# Altium schematic symbol library jlcpcb_2025_04_capacitors_extended_0402.schlib: 3594 symbols (part 6 of 20)
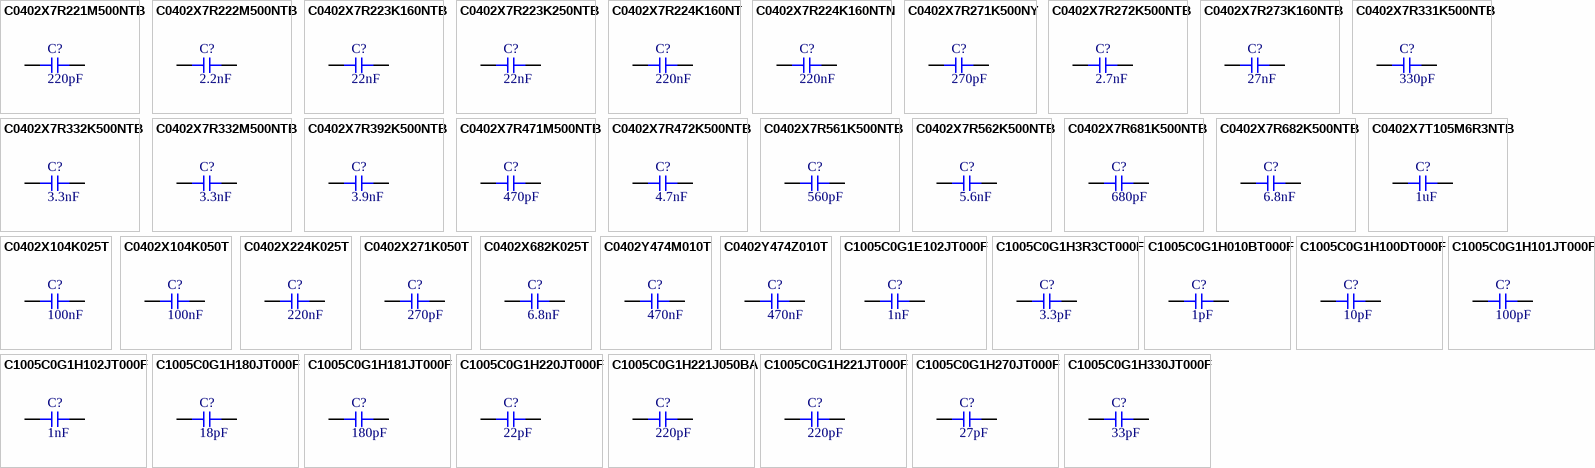
[diagram p94: symbols C0402X7R221M500NTB to C1005C0G1H330JT000F]

## C1005C0G1H221J050BA
designator C?  Capacitance: 220pF  (hidden comment: *)
Capacitor, Ceramic (MLCC), 220pF, ±5%, 50V, C0G, ±5%, SMD 0402; Manufacturer: TDK; Manufacturer Part Number: C1005C0G1H221J050BA; Package Size: 0402; JLCPCB Basic Part: No; JLCPCB Part Number: C2168956; Supplier 1: LCSC; Category: Capacitors - MLCC; Supplier Part Number 1: C2168956; Tolerance: ±5%; Voltage Rating: 50V; Temperature Coefficient: C0G; RoHS: Yes; ComponentLink1Description: Datasheet; ComponentLink1URL: https://wmsc.lcsc.com/wmsc/upload/file/pdf/v2/lcsc/2304140030_TDK-C1005C0G1H221J050BA_C2168956.pdf; ComponentLink2Description: JLCPCB Part URL; ComponentLink2URL: https://jlcpcb.com/partdetail/C2168956; ComponentLink3Description: LCSC Part URL; ComponentLink3URL: https://lcsc.com/product-detail/Multilayer-Ceramic-Capacitors-MLCC---SMD-SMT_TDK-TDK-C1005C0G1H221J050BA_C2168956.html
footprint CAP-0402 (0402 (1005M) Capacitor)
pins: 1, 2

## C1005C0G1H221JT000F
designator C?  Capacitance: 220pF  (hidden comment: *)
Capacitor, Ceramic (MLCC), 220pF, ±5%, 50V, C0G, ±5%, SMD 0402; Manufacturer: TDK; Manufacturer Part Number: C1005C0G1H221JT000F; Package Size: 0402; JLCPCB Basic Part: No; JLCPCB Part Number: C695125; Supplier 1: LCSC; Category: Capacitors - MLCC; Supplier Part Number 1: C695125; Tolerance: ±5%; Voltage Rating: 50V; Temperature Coefficient: C0G; RoHS: Yes; ComponentLink1Description: Datasheet; ComponentLink1URL: https://wmsc.lcsc.com/wmsc/upload/file/pdf/v2/lcsc/2304140030_TDK-C1005C0G1H221JT000F_C695125.pdf; ComponentLink2Description: JLCPCB Part URL; ComponentLink2URL: https://jlcpcb.com/partdetail/C695125; ComponentLink3Description: LCSC Part URL; ComponentLink3URL: https://lcsc.com/product-detail/Multilayer-Ceramic-Capacitors-MLCC---SMD-SMT_TDK-TDK-C1005C0G1H221JT000F_C695125.html
footprint CAP-0402 (0402 (1005M) Capacitor)
pins: 1, 2

## C1005C0G1H270JT000F
designator C?  Capacitance: 27pF  (hidden comment: *)
Capacitor, Ceramic (MLCC), 27pF, ±5%, 50V, C0G, ±5%, SMD 0402; Manufacturer: TDK; Manufacturer Part Number: C1005C0G1H270JT000F; Package Size: 0402; JLCPCB Basic Part: No; JLCPCB Part Number: C445761; Supplier 1: LCSC; Category: Capacitors - MLCC; Supplier Part Number 1: C445761; Tolerance: ±5%; Voltage Rating: 50V; Temperature Coefficient: C0G; RoHS: Yes; ComponentLink1Description: Datasheet; ComponentLink1URL: https://wmsc.lcsc.com/wmsc/upload/file/pdf/v2/lcsc/2304140030_TDK-C1005C0G1H270JT000F_C445761.pdf; ComponentLink2Description: JLCPCB Part URL; ComponentLink2URL: https://jlcpcb.com/partdetail/C445761; ComponentLink3Description: LCSC Part URL; ComponentLink3URL: https://lcsc.com/product-detail/Multilayer-Ceramic-Capacitors-MLCC---SMD-SMT_TDK-TDK-C1005C0G1H270JT000F_C445761.html
footprint CAP-0402 (0402 (1005M) Capacitor)
pins: 1, 2

## C1005C0G1H330JT000F
designator C?  Capacitance: 33pF  (hidden comment: *)
Capacitor, Ceramic (MLCC), 33pF, ±5%, 50V, C0G, ±5%, SMD 0402; Manufacturer: TDK; Manufacturer Part Number: C1005C0G1H330JT000F; Package Size: 0402; JLCPCB Basic Part: No; JLCPCB Part Number: C445760; Supplier 1: LCSC; Category: Capacitors - MLCC; Supplier Part Number 1: C445760; Tolerance: ±5%; Voltage Rating: 50V; Temperature Coefficient: C0G; RoHS: Yes; ComponentLink1Description: Datasheet; ComponentLink1URL: https://wmsc.lcsc.com/wmsc/upload/file/pdf/v2/lcsc/2304140030_TDK-C1005C0G1H330JT000F_C445760.pdf; ComponentLink2Description: JLCPCB Part URL; ComponentLink2URL: https://jlcpcb.com/partdetail/C445760; ComponentLink3Description: LCSC Part URL; ComponentLink3URL: https://lcsc.com/product-detail/Multilayer-Ceramic-Capacitors-MLCC---SMD-SMT_TDK-TDK-C1005C0G1H330JT000F_C445760.html
footprint CAP-0402 (0402 (1005M) Capacitor)
pins: 1, 2

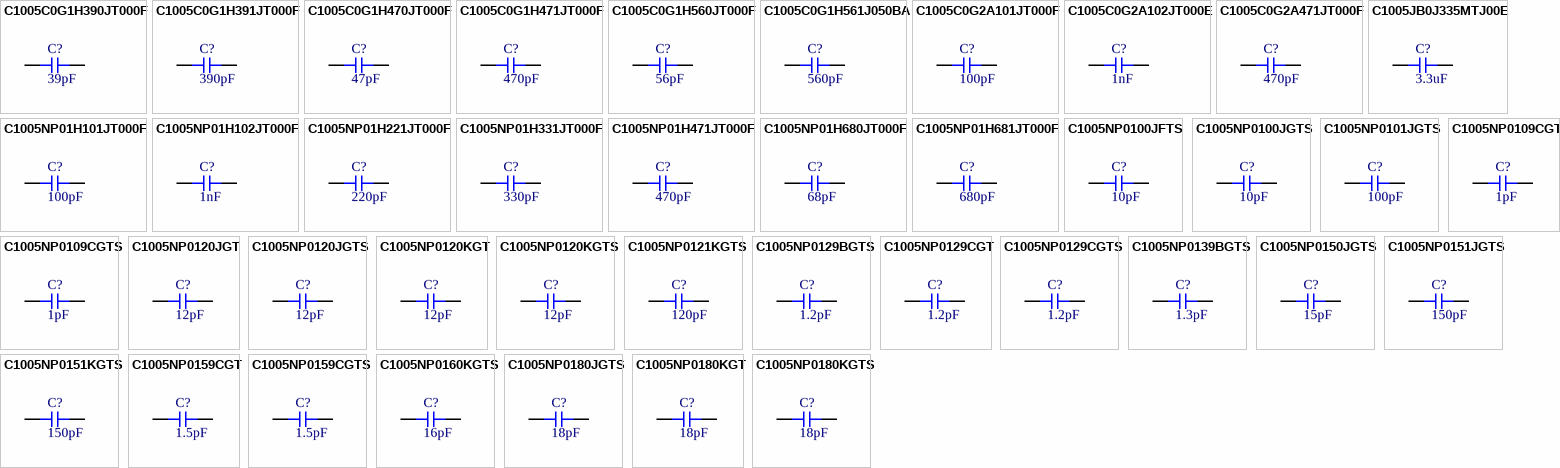
[diagram p23: symbols C1005C0G1H390JT000F to C1005NP0180KGTS]

## C1005C0G1H390JT000F
designator C?  Capacitance: 39pF  (hidden comment: *)
Capacitor, Ceramic (MLCC), 39pF, ±5%, 50V, C0G, ±5%, SMD 0402; Manufacturer: TDK; Manufacturer Part Number: C1005C0G1H390JT000F; Package Size: 0402; JLCPCB Basic Part: No; JLCPCB Part Number: C694151; Supplier 1: LCSC; Category: Capacitors - MLCC; Supplier Part Number 1: C694151; Tolerance: ±5%; Voltage Rating: 50V; Temperature Coefficient: C0G; RoHS: Yes; ComponentLink1Description: Datasheet; ComponentLink1URL: https://wmsc.lcsc.com/wmsc/upload/file/pdf/v2/lcsc/2304140030_TDK-C1005C0G1H390JT000F_C694151.pdf; ComponentLink2Description: JLCPCB Part URL; ComponentLink2URL: https://jlcpcb.com/partdetail/C694151; ComponentLink3Description: LCSC Part URL; ComponentLink3URL: https://lcsc.com/product-detail/Multilayer-Ceramic-Capacitors-MLCC---SMD-SMT_TDK-TDK-C1005C0G1H390JT000F_C694151.html
footprint CAP-0402 (0402 (1005M) Capacitor)
pins: 1, 2

## C1005C0G1H391JT000F
designator C?  Capacitance: 390pF  (hidden comment: *)
Capacitor, Ceramic (MLCC), 390pF, ±5%, 50V, C0G, ±5%, SMD 0402; Manufacturer: TDK; Manufacturer Part Number: C1005C0G1H391JT000F; Package Size: 0402; JLCPCB Basic Part: No; JLCPCB Part Number: C76592; Supplier 1: LCSC; Category: Capacitors - MLCC; Supplier Part Number 1: C76592; Tolerance: ±5%; Voltage Rating: 50V; Temperature Coefficient: C0G; RoHS: Yes; ComponentLink1Description: Datasheet; ComponentLink1URL: https://wmsc.lcsc.com/wmsc/upload/file/pdf/v2/lcsc/2304140030_TDK-C1005C0G1H391JT000F_C76592.pdf; ComponentLink2Description: JLCPCB Part URL; ComponentLink2URL: https://jlcpcb.com/partdetail/C76592; ComponentLink3Description: LCSC Part URL; ComponentLink3URL: https://lcsc.com/product-detail/Multilayer-Ceramic-Capacitors-MLCC---SMD-SMT_TDK-TDK-C1005C0G1H391JT000F_C76592.html
footprint CAP-0402 (0402 (1005M) Capacitor)
pins: 1, 2

## C1005C0G1H470JT000F
designator C?  Capacitance: 47pF  (hidden comment: *)
Capacitor, Ceramic (MLCC), 47pF, ±5%, 50V, C0G, ±5%, SMD 0402; Manufacturer: TDK; Manufacturer Part Number: C1005C0G1H470JT000F; Package Size: 0402; JLCPCB Basic Part: No; JLCPCB Part Number: C694269; Supplier 1: LCSC; Category: Capacitors - MLCC; Supplier Part Number 1: C694269; Tolerance: ±5%; Voltage Rating: 50V; Temperature Coefficient: C0G; RoHS: Yes; ComponentLink1Description: Datasheet; ComponentLink1URL: https://wmsc.lcsc.com/wmsc/upload/file/pdf/v2/lcsc/2304140030_TDK-C1005C0G1H470JT000F_C694269.pdf; ComponentLink2Description: JLCPCB Part URL; ComponentLink2URL: https://jlcpcb.com/partdetail/C694269; ComponentLink3Description: LCSC Part URL; ComponentLink3URL: https://lcsc.com/product-detail/Multilayer-Ceramic-Capacitors-MLCC---SMD-SMT_TDK-TDK-C1005C0G1H470JT000F_C694269.html
footprint CAP-0402 (0402 (1005M) Capacitor)
pins: 1, 2

## C1005C0G1H471JT000F
designator C?  Capacitance: 470pF  (hidden comment: *)
Capacitor, Ceramic (MLCC), 470pF, ±5%, 50V, C0G, ±5%, SMD 0402; Manufacturer: TDK; Manufacturer Part Number: C1005C0G1H471JT000F; Package Size: 0402; JLCPCB Basic Part: No; JLCPCB Part Number: C694153; Supplier 1: LCSC; Category: Capacitors - MLCC; Supplier Part Number 1: C694153; Tolerance: ±5%; Voltage Rating: 50V; Temperature Coefficient: C0G; RoHS: Yes; ComponentLink1Description: Datasheet; ComponentLink1URL: https://wmsc.lcsc.com/wmsc/upload/file/pdf/v2/lcsc/2304140030_TDK-C1005C0G1H471JT000F_C694153.pdf; ComponentLink2Description: JLCPCB Part URL; ComponentLink2URL: https://jlcpcb.com/partdetail/C694153; ComponentLink3Description: LCSC Part URL; ComponentLink3URL: https://lcsc.com/product-detail/Multilayer-Ceramic-Capacitors-MLCC---SMD-SMT_TDK-TDK-C1005C0G1H471JT000F_C694153.html
footprint CAP-0402 (0402 (1005M) Capacitor)
pins: 1, 2

## C1005C0G1H560JT000F
designator C?  Capacitance: 56pF  (hidden comment: *)
Capacitor, Ceramic (MLCC), 56pF, ±5%, 50V, C0G, ±5%, SMD 0402; Manufacturer: TDK; Manufacturer Part Number: C1005C0G1H560JT000F; Package Size: 0402; JLCPCB Basic Part: No; JLCPCB Part Number: C694155; Supplier 1: LCSC; Category: Capacitors - MLCC; Supplier Part Number 1: C694155; Tolerance: ±5%; Voltage Rating: 50V; Temperature Coefficient: C0G; RoHS: Yes; ComponentLink1Description: Datasheet; ComponentLink1URL: https://wmsc.lcsc.com/wmsc/upload/file/pdf/v2/lcsc/2304140030_TDK-C1005C0G1H560JT000F_C694155.pdf; ComponentLink2Description: JLCPCB Part URL; ComponentLink2URL: https://jlcpcb.com/partdetail/C694155; ComponentLink3Description: LCSC Part URL; ComponentLink3URL: https://lcsc.com/product-detail/Multilayer-Ceramic-Capacitors-MLCC---SMD-SMT_TDK-TDK-C1005C0G1H560JT000F_C694155.html
footprint CAP-0402 (0402 (1005M) Capacitor)
pins: 1, 2

## C1005C0G1H561J050BA
designator C?  Capacitance: 560pF  (hidden comment: *)
Capacitor, Ceramic (MLCC), 560pF, ±5%, 50V, C0G, ±5%, SMD 0402; Manufacturer: TDK; Manufacturer Part Number: C1005C0G1H561J050BA; Package Size: 0402; JLCPCB Basic Part: No; JLCPCB Part Number: C3877038; Supplier 1: LCSC; Category: Capacitors - MLCC; Supplier Part Number 1: C3877038; Tolerance: ±5%; Voltage Rating: 50V; Temperature Coefficient: C0G; RoHS: Yes; ComponentLink1Description: Datasheet; ComponentLink1URL: https://wmsc.lcsc.com/wmsc/upload/file/pdf/v2/lcsc/2401221347_TDK-C1005C0G1H561J050BA_C3877038.pdf; ComponentLink2Description: JLCPCB Part URL; ComponentLink2URL: https://jlcpcb.com/partdetail/C3877038; ComponentLink3Description: LCSC Part URL; ComponentLink3URL: https://lcsc.com/product-detail/Multilayer-Ceramic-Capacitors-MLCC---SMD-SMT_TDK-TDK-C1005C0G1H561J050BA_C3877038.html
footprint CAP-0402 (0402 (1005M) Capacitor)
pins: 1, 2

## C1005C0G2A101JT000F
designator C?  Capacitance: 100pF  (hidden comment: *)
Capacitor, Ceramic (MLCC), 100pF, ±5%, 100V, C0G, ±5%, SMD 0402; Manufacturer: TDK; Manufacturer Part Number: C1005C0G2A101JT000F; Package Size: 0402; JLCPCB Basic Part: No; JLCPCB Part Number: C343055; Supplier 1: LCSC; Category: Capacitors - MLCC; Supplier Part Number 1: C343055; Tolerance: ±5%; Voltage Rating: 100V; Temperature Coefficient: C0G; RoHS: Yes; ComponentLink1Description: Datasheet; ComponentLink1URL: https://wmsc.lcsc.com/wmsc/upload/file/pdf/v2/lcsc/2304140030_TDK-C1005C0G2A101JT000F_C343055.pdf; ComponentLink2Description: JLCPCB Part URL; ComponentLink2URL: https://jlcpcb.com/partdetail/C343055; ComponentLink3Description: LCSC Part URL; ComponentLink3URL: https://lcsc.com/product-detail/Multilayer-Ceramic-Capacitors-MLCC---SMD-SMT_TDK-TDK-C1005C0G2A101JT000F_C343055.html
footprint CAP-0402 (0402 (1005M) Capacitor)
pins: 1, 2

## C1005C0G2A102JT000E
designator C?  Capacitance: 1nF  (hidden comment: *)
Capacitor, Ceramic (MLCC), 1nF, ±5%, 100V, C0G, ±5%, SMD 0402; Manufacturer: TDK; Manufacturer Part Number: C1005C0G2A102JT000E; Package Size: 0402; JLCPCB Basic Part: No; JLCPCB Part Number: C694157; Supplier 1: LCSC; Category: Capacitors - MLCC; Supplier Part Number 1: C694157; Tolerance: ±5%; Voltage Rating: 100V; Temperature Coefficient: C0G; RoHS: Yes; ComponentLink1Description: Datasheet; ComponentLink1URL: https://wmsc.lcsc.com/wmsc/upload/file/pdf/v2/lcsc/2304140030_TDK-C1005C0G2A102JT000E_C694157.pdf; ComponentLink2Description: JLCPCB Part URL; ComponentLink2URL: https://jlcpcb.com/partdetail/C694157; ComponentLink3Description: LCSC Part URL; ComponentLink3URL: https://lcsc.com/product-detail/Multilayer-Ceramic-Capacitors-MLCC---SMD-SMT_TDK-TDK-C1005C0G2A102JT000E_C694157.html
footprint CAP-0402 (0402 (1005M) Capacitor)
pins: 1, 2

## C1005C0G2A471JT000F
designator C?  Capacitance: 470pF  (hidden comment: *)
Capacitor, Ceramic (MLCC), 470pF, ±5%, 100V, C0G, ±5%, SMD 0402; Manufacturer: TDK; Manufacturer Part Number: C1005C0G2A471JT000F; Package Size: 0402; JLCPCB Basic Part: No; JLCPCB Part Number: C694158; Supplier 1: LCSC; Category: Capacitors - MLCC; Supplier Part Number 1: C694158; Tolerance: ±5%; Voltage Rating: 100V; Temperature Coefficient: C0G; RoHS: Yes; ComponentLink1Description: Datasheet; ComponentLink1URL: https://wmsc.lcsc.com/wmsc/upload/file/pdf/v2/lcsc/2304140030_TDK-C1005C0G2A471JT000F_C694158.pdf; ComponentLink2Description: JLCPCB Part URL; ComponentLink2URL: https://jlcpcb.com/partdetail/C694158; ComponentLink3Description: LCSC Part URL; ComponentLink3URL: https://lcsc.com/product-detail/Multilayer-Ceramic-Capacitors-MLCC---SMD-SMT_TDK-TDK-C1005C0G2A471JT000F_C694158.html
footprint CAP-0402 (0402 (1005M) Capacitor)
pins: 1, 2

## C1005JB0J335MTJ00E
designator C?  Capacitance: 3.3uF  (hidden comment: *)
Capacitor, Ceramic (MLCC), 3.3uF, ±20%, 6.3V, ±20%, SMD 0402; Manufacturer: TDK; Manufacturer Part Number: C1005JB0J335MTJ00E; Package Size: 0402; JLCPCB Basic Part: No; JLCPCB Part Number: C694159; Supplier 1: LCSC; Category: Capacitors - MLCC; Supplier Part Number 1: C694159; Tolerance: ±20%; Voltage Rating: 6.3V; RoHS: Yes; ComponentLink1Description: Datasheet; ComponentLink1URL: https://wmsc.lcsc.com/wmsc/upload/file/pdf/v2/lcsc/2304140030_TDK-C1005JB0J335MTJ00E_C694159.pdf; ComponentLink2Description: JLCPCB Part URL; ComponentLink2URL: https://jlcpcb.com/partdetail/C694159; ComponentLink3Description: LCSC Part URL; ComponentLink3URL: https://lcsc.com/product-detail/Multilayer-Ceramic-Capacitors-MLCC---SMD-SMT_TDK-TDK-C1005JB0J335MTJ00E_C694159.html
footprint CAP-0402 (0402 (1005M) Capacitor)
pins: 1, 2

## C1005NP01H101JT000F
designator C?  Capacitance: 100pF  (hidden comment: *)
Capacitor, Ceramic (MLCC), 100pF, ±5%, 50V, NP0, ±5%, SMD 0402; Manufacturer: TDK; Manufacturer Part Number: C1005NP01H101JT000F; Package Size: 0402; JLCPCB Basic Part: No; JLCPCB Part Number: C343043; Supplier 1: LCSC; Category: Capacitors - MLCC; Supplier Part Number 1: C343043; Tolerance: ±5%; Voltage Rating: 50V; Temperature Coefficient: NP0; RoHS: Yes; ComponentLink1Description: Datasheet; ComponentLink1URL: https://wmsc.lcsc.com/wmsc/upload/file/pdf/v2/lcsc/2304140030_TDK-C1005NP01H101JT000F_C343043.pdf; ComponentLink2Description: JLCPCB Part URL; ComponentLink2URL: https://jlcpcb.com/partdetail/C343043; ComponentLink3Description: LCSC Part URL; ComponentLink3URL: https://lcsc.com/product-detail/Multilayer-Ceramic-Capacitors-MLCC---SMD-SMT_TDK-TDK-C1005NP01H101JT000F_C343043.html
footprint CAP-0402 (0402 (1005M) Capacitor)
pins: 1, 2

## C1005NP01H102JT000F
designator C?  Capacitance: 1nF  (hidden comment: *)
Capacitor, Ceramic (MLCC), 1nF, ±5%, 50V, NP0, ±5%, SMD 0402; Manufacturer: TDK; Manufacturer Part Number: C1005NP01H102JT000F; Package Size: 0402; JLCPCB Basic Part: No; JLCPCB Part Number: C342982; Supplier 1: LCSC; Category: Capacitors - MLCC; Supplier Part Number 1: C342982; Tolerance: ±5%; Voltage Rating: 50V; Temperature Coefficient: NP0; RoHS: Yes; ComponentLink1Description: Datasheet; ComponentLink1URL: https://wmsc.lcsc.com/wmsc/upload/file/pdf/v2/lcsc/2304140030_TDK-C1005NP01H102JT000F_C342982.pdf; ComponentLink2Description: JLCPCB Part URL; ComponentLink2URL: https://jlcpcb.com/partdetail/C342982; ComponentLink3Description: LCSC Part URL; ComponentLink3URL: https://lcsc.com/product-detail/Multilayer-Ceramic-Capacitors-MLCC---SMD-SMT_TDK-TDK-C1005NP01H102JT000F_C342982.html
footprint CAP-0402 (0402 (1005M) Capacitor)
pins: 1, 2

## C1005NP01H221JT000F
designator C?  Capacitance: 220pF  (hidden comment: *)
Capacitor, Ceramic (MLCC), 220pF, ±5%, 50V, NP0, ±5%, SMD 0402; Manufacturer: TDK; Manufacturer Part Number: C1005NP01H221JT000F; Package Size: 0402; JLCPCB Basic Part: No; JLCPCB Part Number: C343023; Supplier 1: LCSC; Category: Capacitors - MLCC; Supplier Part Number 1: C343023; Tolerance: ±5%; Voltage Rating: 50V; Temperature Coefficient: NP0; RoHS: Yes; ComponentLink1Description: Datasheet; ComponentLink1URL: https://wmsc.lcsc.com/wmsc/upload/file/pdf/v2/lcsc/2304140030_TDK-C1005NP01H221JT000F_C343023.pdf; ComponentLink2Description: JLCPCB Part URL; ComponentLink2URL: https://jlcpcb.com/partdetail/C343023; ComponentLink3Description: LCSC Part URL; ComponentLink3URL: https://lcsc.com/product-detail/Multilayer-Ceramic-Capacitors-MLCC---SMD-SMT_TDK-TDK-C1005NP01H221JT000F_C343023.html
footprint CAP-0402 (0402 (1005M) Capacitor)
pins: 1, 2

## C1005NP01H331JT000F
designator C?  Capacitance: 330pF  (hidden comment: *)
Capacitor, Ceramic (MLCC), 330pF, ±5%, 50V, NP0, ±5%, SMD 0402; Manufacturer: TDK; Manufacturer Part Number: C1005NP01H331JT000F; Package Size: 0402; JLCPCB Basic Part: No; JLCPCB Part Number: C343018; Supplier 1: LCSC; Category: Capacitors - MLCC; Supplier Part Number 1: C343018; Tolerance: ±5%; Voltage Rating: 50V; Temperature Coefficient: NP0; RoHS: Yes; ComponentLink1Description: Datasheet; ComponentLink1URL: https://wmsc.lcsc.com/wmsc/upload/file/pdf/v2/lcsc/2304140030_TDK-C1005NP01H331JT000F_C343018.pdf; ComponentLink2Description: JLCPCB Part URL; ComponentLink2URL: https://jlcpcb.com/partdetail/C343018; ComponentLink3Description: LCSC Part URL; ComponentLink3URL: https://lcsc.com/product-detail/Multilayer-Ceramic-Capacitors-MLCC---SMD-SMT_TDK-TDK-C1005NP01H331JT000F_C343018.html
footprint CAP-0402 (0402 (1005M) Capacitor)
pins: 1, 2

## C1005NP01H471JT000F
designator C?  Capacitance: 470pF  (hidden comment: *)
Capacitor, Ceramic (MLCC), 470pF, ±5%, 50V, NP0, ±5%, SMD 0402; Manufacturer: TDK; Manufacturer Part Number: C1005NP01H471JT000F; Package Size: 0402; JLCPCB Basic Part: No; JLCPCB Part Number: C343011; Supplier 1: LCSC; Category: Capacitors - MLCC; Supplier Part Number 1: C343011; Tolerance: ±5%; Voltage Rating: 50V; Temperature Coefficient: NP0; RoHS: Yes; ComponentLink1Description: Datasheet; ComponentLink1URL: https://wmsc.lcsc.com/wmsc/upload/file/pdf/v2/lcsc/2304140030_TDK-C1005NP01H471JT000F_C343011.pdf; ComponentLink2Description: JLCPCB Part URL; ComponentLink2URL: https://jlcpcb.com/partdetail/C343011; ComponentLink3Description: LCSC Part URL; ComponentLink3URL: https://lcsc.com/product-detail/Multilayer-Ceramic-Capacitors-MLCC---SMD-SMT_TDK-TDK-C1005NP01H471JT000F_C343011.html
footprint CAP-0402 (0402 (1005M) Capacitor)
pins: 1, 2

## C1005NP01H680JT000F
designator C?  Capacitance: 68pF  (hidden comment: *)
Capacitor, Ceramic (MLCC), 68pF, ±5%, 50V, NP0, ±5%, SMD 0402; Manufacturer: TDK; Manufacturer Part Number: C1005NP01H680JT000F; Package Size: 0402; JLCPCB Basic Part: No; JLCPCB Part Number: C343045; Supplier 1: LCSC; Category: Capacitors - MLCC; Supplier Part Number 1: C343045; Tolerance: ±5%; Voltage Rating: 50V; Temperature Coefficient: NP0; RoHS: Yes; ComponentLink1Description: Datasheet; ComponentLink1URL: https://wmsc.lcsc.com/wmsc/upload/file/pdf/v2/lcsc/1912111437_TDK-C1005NP01H680JT000F_C343045.pdf; ComponentLink2Description: JLCPCB Part URL; ComponentLink2URL: https://jlcpcb.com/partdetail/C343045; ComponentLink3Description: LCSC Part URL; ComponentLink3URL: https://lcsc.com/product-detail/Multilayer-Ceramic-Capacitors-MLCC---SMD-SMT_TDK-TDK-C1005NP01H680JT000F_C343045.html
footprint CAP-0402 (0402 (1005M) Capacitor)
pins: 1, 2

## C1005NP01H681JT000F
designator C?  Capacitance: 680pF  (hidden comment: *)
Capacitor, Ceramic (MLCC), 680pF, ±5%, 50V, NP0, ±5%, SMD 0402; Manufacturer: TDK; Manufacturer Part Number: C1005NP01H681JT000F; Package Size: 0402; JLCPCB Basic Part: No; JLCPCB Part Number: C343004; Supplier 1: LCSC; Category: Capacitors - MLCC; Supplier Part Number 1: C343004; Tolerance: ±5%; Voltage Rating: 50V; Temperature Coefficient: NP0; RoHS: Yes; ComponentLink1Description: Datasheet; ComponentLink1URL: https://wmsc.lcsc.com/wmsc/upload/file/pdf/v2/lcsc/2304140030_TDK-C1005NP01H681JT000F_C343004.pdf; ComponentLink2Description: JLCPCB Part URL; ComponentLink2URL: https://jlcpcb.com/partdetail/C343004; ComponentLink3Description: LCSC Part URL; ComponentLink3URL: https://lcsc.com/product-detail/Multilayer-Ceramic-Capacitors-MLCC---SMD-SMT_TDK-TDK-C1005NP01H681JT000F_C343004.html
footprint CAP-0402 (0402 (1005M) Capacitor)
pins: 1, 2

## C1005NP0100JFTS
designator C?  Capacitance: 10pF  (hidden comment: *)
Capacitor, Ceramic (MLCC), 10pF, 25V, NP0, SMD 0402; Manufacturer: Darfon Elec; Manufacturer Part Number: C1005NP0100JFTS; Package Size: 0402; JLCPCB Basic Part: No; JLCPCB Part Number: C2987820; Supplier 1: LCSC; Category: Capacitors - MLCC; Supplier Part Number 1: C2987820; Voltage Rating: 25V; Temperature Coefficient: NP0; RoHS: Yes; ComponentLink1Description: Datasheet; ComponentLink1URL: https://wmsc.lcsc.com/wmsc/upload/file/pdf/v2/lcsc/2204011630_Darfon-Elec-C1005NP0100JFTS_C2987820.pdf; ComponentLink2Description: JLCPCB Part URL; ComponentLink2URL: https://jlcpcb.com/partdetail/C2987820; ComponentLink3Description: LCSC Part URL; ComponentLink3URL: https://lcsc.com/product-detail/Multilayer-Ceramic-Capacitors-MLCC---SMD-SMT_Darfon-Elec-Darfon-Elec-C1005NP0100JFTS_C2987820.html
footprint CAP-0402 (0402 (1005M) Capacitor)
pins: 1, 2

## C1005NP0100JGTS
designator C?  Capacitance: 10pF  (hidden comment: *)
Capacitor, Ceramic (MLCC), 10pF, ±5%, 50V, NP0, ±5%, SMD 0402; Manufacturer: Darfon Elec; Manufacturer Part Number: C1005NP0100JGTS; Package Size: 0402; JLCPCB Basic Part: No; JLCPCB Part Number: C258501; Supplier 1: LCSC; Category: Capacitors - MLCC; Supplier Part Number 1: C258501; Tolerance: ±5%; Voltage Rating: 50V; Temperature Coefficient: NP0; RoHS: Yes; ComponentLink1Description: Datasheet; ComponentLink1URL: https://wmsc.lcsc.com/wmsc/upload/file/pdf/v2/lcsc/2304140030_Darfon-Elec-C1005NP0100JGTS_C258501.pdf; ComponentLink2Description: JLCPCB Part URL; ComponentLink2URL: https://jlcpcb.com/partdetail/C258501; ComponentLink3Description: LCSC Part URL; ComponentLink3URL: https://lcsc.com/product-detail/Multilayer-Ceramic-Capacitors-MLCC---SMD-SMT_Darfon-Elec-Darfon-Elec-C1005NP0100JGTS_C258501.html
footprint CAP-0402 (0402 (1005M) Capacitor)
pins: 1, 2

## C1005NP0101JGTS
designator C?  Capacitance: 100pF  (hidden comment: *)
Capacitor, Ceramic (MLCC), 100pF, ±5%, 50V, NP0, ±5%, SMD 0402; Manufacturer: Darfon Elec; Manufacturer Part Number: C1005NP0101JGTS; Package Size: 0402; JLCPCB Basic Part: No; JLCPCB Part Number: C147476; Supplier 1: LCSC; Category: Capacitors - MLCC; Supplier Part Number 1: C147476; Tolerance: ±5%; Voltage Rating: 50V; Temperature Coefficient: NP0; RoHS: Yes; ComponentLink1Description: Datasheet; ComponentLink1URL: https://wmsc.lcsc.com/wmsc/upload/file/pdf/v2/lcsc/2304140030_Darfon-Elec-C1005NP0101JGTS_C147476.pdf; ComponentLink2Description: JLCPCB Part URL; ComponentLink2URL: https://jlcpcb.com/partdetail/C147476; ComponentLink3Description: LCSC Part URL; ComponentLink3URL: https://lcsc.com/product-detail/Multilayer-Ceramic-Capacitors-MLCC---SMD-SMT_Darfon-Elec-Darfon-Elec-C1005NP0101JGTS_C147476.html
footprint CAP-0402 (0402 (1005M) Capacitor)
pins: 1, 2

## C1005NP0109CGT
designator C?  Capacitance: 1pF  (hidden comment: *)
Capacitor, Ceramic (MLCC), 1pF, 50V, NP0, SMD 0402; Manufacturer: Darfon Elec; Manufacturer Part Number: C1005NP0109CGT; Package Size: 0402; JLCPCB Basic Part: No; JLCPCB Part Number: C258486; Supplier 1: LCSC; Category: Capacitors - MLCC; Supplier Part Number 1: C258486; Voltage Rating: 50V; Temperature Coefficient: NP0; RoHS: Yes; ComponentLink1Description: Datasheet; ComponentLink1URL: https://wmsc.lcsc.com/wmsc/upload/file/pdf/v2/lcsc/2304140030_Darfon-Elec-C1005NP0109CGT_C258486.pdf; ComponentLink2Description: JLCPCB Part URL; ComponentLink2URL: https://jlcpcb.com/partdetail/C258486; ComponentLink3Description: LCSC Part URL; ComponentLink3URL: https://lcsc.com/product-detail/Multilayer-Ceramic-Capacitors-MLCC---SMD-SMT_Darfon-Elec-Darfon-Elec-C1005NP0109CGT_C258486.html
footprint CAP-0402 (0402 (1005M) Capacitor)
pins: 1, 2

## C1005NP0109CGTS
designator C?  Capacitance: 1pF  (hidden comment: *)
Capacitor, Ceramic (MLCC), 1pF, 50V, NP0, SMD 0402; Manufacturer: Darfon Elec; Manufacturer Part Number: C1005NP0109CGTS; Package Size: 0402; JLCPCB Basic Part: No; JLCPCB Part Number: C147337; Supplier 1: LCSC; Category: Capacitors - MLCC; Supplier Part Number 1: C147337; Voltage Rating: 50V; Temperature Coefficient: NP0; RoHS: Yes; ComponentLink1Description: Datasheet; ComponentLink1URL: https://wmsc.lcsc.com/wmsc/upload/file/pdf/v2/lcsc/2304140030_Darfon-Elec-C1005NP0109CGTS_C147337.pdf; ComponentLink2Description: JLCPCB Part URL; ComponentLink2URL: https://jlcpcb.com/partdetail/C147337; ComponentLink3Description: LCSC Part URL; ComponentLink3URL: https://lcsc.com/product-detail/Multilayer-Ceramic-Capacitors-MLCC---SMD-SMT_Darfon-Elec-Darfon-Elec-C1005NP0109CGTS_C147337.html
footprint CAP-0402 (0402 (1005M) Capacitor)
pins: 1, 2

## C1005NP0120JGT
designator C?  Capacitance: 12pF  (hidden comment: *)
Capacitor, Ceramic (MLCC), 12pF, ±5%, 50V, NP0, ±5%, SMD 0402; Manufacturer: Darfon Elec; Manufacturer Part Number: C1005NP0120JGT; Package Size: 0402; JLCPCB Basic Part: No; JLCPCB Part Number: C359298; Supplier 1: LCSC; Category: Capacitors - MLCC; Supplier Part Number 1: C359298; Tolerance: ±5%; Voltage Rating: 50V; Temperature Coefficient: NP0; RoHS: Yes; ComponentLink1Description: Datasheet; ComponentLink1URL: https://wmsc.lcsc.com/wmsc/upload/file/pdf/v2/lcsc/2304140030_Darfon-Elec-C1005NP0120JGT_C359298.pdf; ComponentLink2Description: JLCPCB Part URL; ComponentLink2URL: https://jlcpcb.com/partdetail/C359298; ComponentLink3Description: LCSC Part URL; ComponentLink3URL: https://lcsc.com/product-detail/Multilayer-Ceramic-Capacitors-MLCC---SMD-SMT_Darfon-Elec-Darfon-Elec-C1005NP0120JGT_C359298.html
footprint CAP-0402 (0402 (1005M) Capacitor)
pins: 1, 2

## C1005NP0120JGTS
designator C?  Capacitance: 12pF  (hidden comment: *)
Capacitor, Ceramic (MLCC), 12pF, ±5%, 50V, NP0, ±5%, SMD 0402; Manufacturer: Darfon Elec; Manufacturer Part Number: C1005NP0120JGTS; Package Size: 0402; JLCPCB Basic Part: No; JLCPCB Part Number: C147414; Supplier 1: LCSC; Category: Capacitors - MLCC; Supplier Part Number 1: C147414; Tolerance: ±5%; Voltage Rating: 50V; Temperature Coefficient: NP0; RoHS: Yes; ComponentLink1Description: Datasheet; ComponentLink1URL: https://wmsc.lcsc.com/wmsc/upload/file/pdf/v2/lcsc/2304140030_Darfon-Elec-C1005NP0120JGTS_C147414.pdf; ComponentLink2Description: JLCPCB Part URL; ComponentLink2URL: https://jlcpcb.com/partdetail/C147414; ComponentLink3Description: LCSC Part URL; ComponentLink3URL: https://lcsc.com/product-detail/Multilayer-Ceramic-Capacitors-MLCC---SMD-SMT_Darfon-Elec-Darfon-Elec-C1005NP0120JGTS_C147414.html
footprint CAP-0402 (0402 (1005M) Capacitor)
pins: 1, 2

## C1005NP0120KGT
designator C?  Capacitance: 12pF  (hidden comment: *)
Capacitor, Ceramic (MLCC), 12pF, ±10%, 50V, NP0, ±10%, SMD 0402; Manufacturer: Darfon Elec; Manufacturer Part Number: C1005NP0120KGT; Package Size: 0402; JLCPCB Basic Part: No; JLCPCB Part Number: C258502; Supplier 1: LCSC; Category: Capacitors - MLCC; Supplier Part Number 1: C258502; Tolerance: ±10%; Voltage Rating: 50V; Temperature Coefficient: NP0; RoHS: Yes; ComponentLink1Description: Datasheet; ComponentLink1URL: https://wmsc.lcsc.com/wmsc/upload/file/pdf/v2/lcsc/2304140030_Darfon-Elec-C1005NP0120KGT_C258502.pdf; ComponentLink2Description: JLCPCB Part URL; ComponentLink2URL: https://jlcpcb.com/partdetail/C258502; ComponentLink3Description: LCSC Part URL; ComponentLink3URL: https://lcsc.com/product-detail/Multilayer-Ceramic-Capacitors-MLCC---SMD-SMT_Darfon-Elec-Darfon-Elec-C1005NP0120KGT_C258502.html
footprint CAP-0402 (0402 (1005M) Capacitor)
pins: 1, 2

## C1005NP0120KGTS
designator C?  Capacitance: 12pF  (hidden comment: *)
Capacitor, Ceramic (MLCC), 12pF, ±10%, 50V, NP0, ±10%, SMD 0402; Manufacturer: Darfon Elec; Manufacturer Part Number: C1005NP0120KGTS; Package Size: 0402; JLCPCB Basic Part: No; JLCPCB Part Number: C312116; Supplier 1: LCSC; Category: Capacitors - MLCC; Supplier Part Number 1: C312116; Tolerance: ±10%; Voltage Rating: 50V; Temperature Coefficient: NP0; RoHS: Yes; ComponentLink1Description: Datasheet; ComponentLink1URL: https://wmsc.lcsc.com/wmsc/upload/file/pdf/v2/lcsc/2304140030_Darfon-Elec-C1005NP0120KGTS_C312116.pdf; ComponentLink2Description: JLCPCB Part URL; ComponentLink2URL: https://jlcpcb.com/partdetail/C312116; ComponentLink3Description: LCSC Part URL; ComponentLink3URL: https://lcsc.com/product-detail/Multilayer-Ceramic-Capacitors-MLCC---SMD-SMT_Darfon-Elec-Darfon-Elec-C1005NP0120KGTS_C312116.html
footprint CAP-0402 (0402 (1005M) Capacitor)
pins: 1, 2

## C1005NP0121KGTS
designator C?  Capacitance: 120pF  (hidden comment: *)
Capacitor, Ceramic (MLCC), 120pF, ±10%, 50V, NP0, ±10%, SMD 0402; Manufacturer: Darfon Elec; Manufacturer Part Number: C1005NP0121KGTS; Package Size: 0402; JLCPCB Basic Part: No; JLCPCB Part Number: C561179; Supplier 1: LCSC; Category: Capacitors - MLCC; Supplier Part Number 1: C561179; Tolerance: ±10%; Voltage Rating: 50V; Temperature Coefficient: NP0; RoHS: Yes; ComponentLink1Description: Datasheet; ComponentLink1URL: https://wmsc.lcsc.com/wmsc/upload/file/pdf/v2/lcsc/2006011904_Darfon-Elec-C1005NP0121KGTS_C561179.pdf; ComponentLink2Description: JLCPCB Part URL; ComponentLink2URL: https://jlcpcb.com/partdetail/C561179; ComponentLink3Description: LCSC Part URL; ComponentLink3URL: https://lcsc.com/product-detail/Multilayer-Ceramic-Capacitors-MLCC---SMD-SMT_Darfon-Elec-Darfon-Elec-C1005NP0121KGTS_C561179.html
footprint CAP-0402 (0402 (1005M) Capacitor)
pins: 1, 2

## C1005NP0129BGTS
designator C?  Capacitance: 1.2pF  (hidden comment: *)
Capacitor, Ceramic (MLCC), 1.2pF, 50V, NP0, SMD 0402; Manufacturer: Darfon Elec; Manufacturer Part Number: C1005NP0129BGTS; Package Size: 0402; JLCPCB Basic Part: No; JLCPCB Part Number: C147339; Supplier 1: LCSC; Category: Capacitors - MLCC; Supplier Part Number 1: C147339; Voltage Rating: 50V; Temperature Coefficient: NP0; RoHS: Yes; ComponentLink1Description: Datasheet; ComponentLink1URL: https://wmsc.lcsc.com/wmsc/upload/file/pdf/v2/lcsc/2304140030_Darfon-Elec-C1005NP0129BGTS_C147339.pdf; ComponentLink2Description: JLCPCB Part URL; ComponentLink2URL: https://jlcpcb.com/partdetail/C147339; ComponentLink3Description: LCSC Part URL; ComponentLink3URL: https://lcsc.com/product-detail/Multilayer-Ceramic-Capacitors-MLCC---SMD-SMT_Darfon-Elec-Darfon-Elec-C1005NP0129BGTS_C147339.html
footprint CAP-0402 (0402 (1005M) Capacitor)
pins: 1, 2

## C1005NP0129CGT
designator C?  Capacitance: 1.2pF  (hidden comment: *)
Capacitor, Ceramic (MLCC), 1.2pF, 50V, NP0, SMD 0402; Manufacturer: Darfon Elec; Manufacturer Part Number: C1005NP0129CGT; Package Size: 0402; JLCPCB Basic Part: No; JLCPCB Part Number: C258487; Supplier 1: LCSC; Category: Capacitors - MLCC; Supplier Part Number 1: C258487; Voltage Rating: 50V; Temperature Coefficient: NP0; RoHS: Yes; ComponentLink1Description: Datasheet; ComponentLink1URL: https://wmsc.lcsc.com/wmsc/upload/file/pdf/v2/lcsc/2304140030_Darfon-Elec-C1005NP0129CGT_C258487.pdf; ComponentLink2Description: JLCPCB Part URL; ComponentLink2URL: https://jlcpcb.com/partdetail/C258487; ComponentLink3Description: LCSC Part URL; ComponentLink3URL: https://lcsc.com/product-detail/Multilayer-Ceramic-Capacitors-MLCC---SMD-SMT_Darfon-Elec-Darfon-Elec-C1005NP0129CGT_C258487.html
footprint CAP-0402 (0402 (1005M) Capacitor)
pins: 1, 2

## C1005NP0129CGTS
designator C?  Capacitance: 1.2pF  (hidden comment: *)
Capacitor, Ceramic (MLCC), 1.2pF, 50V, NP0, SMD 0402; Manufacturer: Darfon Elec; Manufacturer Part Number: C1005NP0129CGTS; Package Size: 0402; JLCPCB Basic Part: No; JLCPCB Part Number: C147340; Supplier 1: LCSC; Category: Capacitors - MLCC; Supplier Part Number 1: C147340; Voltage Rating: 50V; Temperature Coefficient: NP0; RoHS: Yes; ComponentLink1Description: Datasheet; ComponentLink1URL: https://wmsc.lcsc.com/wmsc/upload/file/pdf/v2/lcsc/2304140030_Darfon-Elec-C1005NP0129CGTS_C147340.pdf; ComponentLink2Description: JLCPCB Part URL; ComponentLink2URL: https://jlcpcb.com/partdetail/C147340; ComponentLink3Description: LCSC Part URL; ComponentLink3URL: https://lcsc.com/product-detail/Multilayer-Ceramic-Capacitors-MLCC---SMD-SMT_Darfon-Elec-Darfon-Elec-C1005NP0129CGTS_C147340.html
footprint CAP-0402 (0402 (1005M) Capacitor)
pins: 1, 2

## C1005NP0139BGTS
designator C?  Capacitance: 1.3pF  (hidden comment: *)
Capacitor, Ceramic (MLCC), 1.3pF, 50V, NP0, SMD 0402; Manufacturer: Darfon Elec; Manufacturer Part Number: C1005NP0139BGTS; Package Size: 0402; JLCPCB Basic Part: No; JLCPCB Part Number: C147342; Supplier 1: LCSC; Category: Capacitors - MLCC; Supplier Part Number 1: C147342; Voltage Rating: 50V; Temperature Coefficient: NP0; RoHS: Yes; ComponentLink1Description: Datasheet; ComponentLink1URL: https://wmsc.lcsc.com/wmsc/upload/file/pdf/v2/lcsc/2304140030_Darfon-Elec-C1005NP0139BGTS_C147342.pdf; ComponentLink2Description: JLCPCB Part URL; ComponentLink2URL: https://jlcpcb.com/partdetail/C147342; ComponentLink3Description: LCSC Part URL; ComponentLink3URL: https://lcsc.com/product-detail/Multilayer-Ceramic-Capacitors-MLCC---SMD-SMT_Darfon-Elec-Darfon-Elec-C1005NP0139BGTS_C147342.html
footprint CAP-0402 (0402 (1005M) Capacitor)
pins: 1, 2

## C1005NP0150JGTS
designator C?  Capacitance: 15pF  (hidden comment: *)
Capacitor, Ceramic (MLCC), 15pF, ±5%, 50V, NP0, ±5%, SMD 0402; Manufacturer: Darfon Elec; Manufacturer Part Number: C1005NP0150JGTS; Package Size: 0402; JLCPCB Basic Part: No; JLCPCB Part Number: C147418; Supplier 1: LCSC; Category: Capacitors - MLCC; Supplier Part Number 1: C147418; Tolerance: ±5%; Voltage Rating: 50V; Temperature Coefficient: NP0; RoHS: Yes; ComponentLink1Description: Datasheet; ComponentLink1URL: https://wmsc.lcsc.com/wmsc/upload/file/pdf/v2/lcsc/2304140030_Darfon-Elec-C1005NP0150JGTS_C147418.pdf; ComponentLink2Description: JLCPCB Part URL; ComponentLink2URL: https://jlcpcb.com/partdetail/C147418; ComponentLink3Description: LCSC Part URL; ComponentLink3URL: https://lcsc.com/product-detail/Multilayer-Ceramic-Capacitors-MLCC---SMD-SMT_Darfon-Elec-Darfon-Elec-C1005NP0150JGTS_C147418.html
footprint CAP-0402 (0402 (1005M) Capacitor)
pins: 1, 2

## C1005NP0151JGTS
designator C?  Capacitance: 150pF  (hidden comment: *)
Capacitor, Ceramic (MLCC), 150pF, ±5%, 50V, NP0, ±5%, SMD 0402; Manufacturer: Darfon Elec; Manufacturer Part Number: C1005NP0151JGTS; Package Size: 0402; JLCPCB Basic Part: No; JLCPCB Part Number: C147479; Supplier 1: LCSC; Category: Capacitors - MLCC; Supplier Part Number 1: C147479; Tolerance: ±5%; Voltage Rating: 50V; Temperature Coefficient: NP0; RoHS: Yes; ComponentLink1Description: Datasheet; ComponentLink1URL: https://wmsc.lcsc.com/wmsc/upload/file/pdf/v2/lcsc/2304140030_Darfon-Elec-C1005NP0151JGTS_C147479.pdf; ComponentLink2Description: JLCPCB Part URL; ComponentLink2URL: https://jlcpcb.com/partdetail/C147479; ComponentLink3Description: LCSC Part URL; ComponentLink3URL: https://lcsc.com/product-detail/Multilayer-Ceramic-Capacitors-MLCC---SMD-SMT_Darfon-Elec-Darfon-Elec-C1005NP0151JGTS_C147479.html
footprint CAP-0402 (0402 (1005M) Capacitor)
pins: 1, 2

## C1005NP0151KGTS
designator C?  Capacitance: 150pF  (hidden comment: *)
Capacitor, Ceramic (MLCC), 150pF, ±10%, 50V, NP0, ±10%, SMD 0402; Manufacturer: Darfon Elec; Manufacturer Part Number: C1005NP0151KGTS; Package Size: 0402; JLCPCB Basic Part: No; JLCPCB Part Number: C312107; Supplier 1: LCSC; Category: Capacitors - MLCC; Supplier Part Number 1: C312107; Tolerance: ±10%; Voltage Rating: 50V; Temperature Coefficient: NP0; RoHS: Yes; ComponentLink1Description: Datasheet; ComponentLink1URL: https://wmsc.lcsc.com/wmsc/upload/file/pdf/v2/lcsc/2304140030_Darfon-Elec-C1005NP0151KGTS_C312107.pdf; ComponentLink2Description: JLCPCB Part URL; ComponentLink2URL: https://jlcpcb.com/partdetail/C312107; ComponentLink3Description: LCSC Part URL; ComponentLink3URL: https://lcsc.com/product-detail/Multilayer-Ceramic-Capacitors-MLCC---SMD-SMT_Darfon-Elec-Darfon-Elec-C1005NP0151KGTS_C312107.html
footprint CAP-0402 (0402 (1005M) Capacitor)
pins: 1, 2

## C1005NP0159CGT
designator C?  Capacitance: 1.5pF  (hidden comment: *)
Capacitor, Ceramic (MLCC), 1.5pF, 50V, NP0, SMD 0402; Manufacturer: Darfon Elec; Manufacturer Part Number: C1005NP0159CGT; Package Size: 0402; JLCPCB Basic Part: No; JLCPCB Part Number: C258488; Supplier 1: LCSC; Category: Capacitors - MLCC; Supplier Part Number 1: C258488; Voltage Rating: 50V; Temperature Coefficient: NP0; RoHS: Yes; ComponentLink1Description: Datasheet; ComponentLink1URL: https://wmsc.lcsc.com/wmsc/upload/file/pdf/v2/lcsc/2304140030_Darfon-Elec-C1005NP0159CGT_C258488.pdf; ComponentLink2Description: JLCPCB Part URL; ComponentLink2URL: https://jlcpcb.com/partdetail/C258488; ComponentLink3Description: LCSC Part URL; ComponentLink3URL: https://lcsc.com/product-detail/Multilayer-Ceramic-Capacitors-MLCC---SMD-SMT_Darfon-Elec-Darfon-Elec-C1005NP0159CGT_C258488.html
footprint CAP-0402 (0402 (1005M) Capacitor)
pins: 1, 2

## C1005NP0159CGTS
designator C?  Capacitance: 1.5pF  (hidden comment: *)
Capacitor, Ceramic (MLCC), 1.5pF, 50V, NP0, SMD 0402; Manufacturer: Darfon Elec; Manufacturer Part Number: C1005NP0159CGTS; Package Size: 0402; JLCPCB Basic Part: No; JLCPCB Part Number: C147344; Supplier 1: LCSC; Category: Capacitors - MLCC; Supplier Part Number 1: C147344; Voltage Rating: 50V; Temperature Coefficient: NP0; RoHS: Yes; ComponentLink1Description: Datasheet; ComponentLink1URL: https://wmsc.lcsc.com/wmsc/upload/file/pdf/v2/lcsc/2304140030_Darfon-Elec-C1005NP0159CGTS_C147344.pdf; ComponentLink2Description: JLCPCB Part URL; ComponentLink2URL: https://jlcpcb.com/partdetail/C147344; ComponentLink3Description: LCSC Part URL; ComponentLink3URL: https://lcsc.com/product-detail/Multilayer-Ceramic-Capacitors-MLCC---SMD-SMT_Darfon-Elec-Darfon-Elec-C1005NP0159CGTS_C147344.html
footprint CAP-0402 (0402 (1005M) Capacitor)
pins: 1, 2

## C1005NP0160KGTS
designator C?  Capacitance: 16pF  (hidden comment: *)
Capacitor, Ceramic (MLCC), 16pF, ±10%, 50V, NP0, ±10%, SMD 0402; Manufacturer: Darfon Elec; Manufacturer Part Number: C1005NP0160KGTS; Package Size: 0402; JLCPCB Basic Part: No; JLCPCB Part Number: C312099; Supplier 1: LCSC; Category: Capacitors - MLCC; Supplier Part Number 1: C312099; Tolerance: ±10%; Voltage Rating: 50V; Temperature Coefficient: NP0; RoHS: Yes; ComponentLink1Description: Datasheet; ComponentLink1URL: https://wmsc.lcsc.com/wmsc/upload/file/pdf/v2/lcsc/2304140030_Darfon-Elec-C1005NP0160KGTS_C312099.pdf; ComponentLink2Description: JLCPCB Part URL; ComponentLink2URL: https://jlcpcb.com/partdetail/C312099; ComponentLink3Description: LCSC Part URL; ComponentLink3URL: https://lcsc.com/product-detail/Multilayer-Ceramic-Capacitors-MLCC---SMD-SMT_Darfon-Elec-Darfon-Elec-C1005NP0160KGTS_C312099.html
footprint CAP-0402 (0402 (1005M) Capacitor)
pins: 1, 2

## C1005NP0180JGTS
designator C?  Capacitance: 18pF  (hidden comment: *)
Capacitor, Ceramic (MLCC), 18pF, ±5%, 50V, NP0, ±5%, SMD 0402; Manufacturer: Darfon Elec; Manufacturer Part Number: C1005NP0180JGTS; Package Size: 0402; JLCPCB Basic Part: No; JLCPCB Part Number: C359292; Supplier 1: LCSC; Category: Capacitors - MLCC; Supplier Part Number 1: C359292; Tolerance: ±5%; Voltage Rating: 50V; Temperature Coefficient: NP0; RoHS: Yes; ComponentLink1Description: Datasheet; ComponentLink1URL: https://wmsc.lcsc.com/wmsc/upload/file/pdf/v2/lcsc/2304140030_Darfon-Elec-C1005NP0180JGTS_C359292.pdf; ComponentLink2Description: JLCPCB Part URL; ComponentLink2URL: https://jlcpcb.com/partdetail/C359292; ComponentLink3Description: LCSC Part URL; ComponentLink3URL: https://lcsc.com/product-detail/Multilayer-Ceramic-Capacitors-MLCC---SMD-SMT_Darfon-Elec-Darfon-Elec-C1005NP0180JGTS_C359292.html
footprint CAP-0402 (0402 (1005M) Capacitor)
pins: 1, 2

## C1005NP0180KGT
designator C?  Capacitance: 18pF  (hidden comment: *)
Capacitor, Ceramic (MLCC), 18pF, ±10%, 50V, NP0, ±10%, SMD 0402; Manufacturer: Darfon Elec; Manufacturer Part Number: C1005NP0180KGT; Package Size: 0402; JLCPCB Basic Part: No; JLCPCB Part Number: C267387; Supplier 1: LCSC; Category: Capacitors - MLCC; Supplier Part Number 1: C267387; Tolerance: ±10%; Voltage Rating: 50V; Temperature Coefficient: NP0; RoHS: Yes; ComponentLink1Description: Datasheet; ComponentLink1URL: https://wmsc.lcsc.com/wmsc/upload/file/pdf/v2/lcsc/2304140030_Darfon-Elec-C1005NP0180KGT_C267387.pdf; ComponentLink2Description: JLCPCB Part URL; ComponentLink2URL: https://jlcpcb.com/partdetail/C267387; ComponentLink3Description: LCSC Part URL; ComponentLink3URL: https://lcsc.com/product-detail/Multilayer-Ceramic-Capacitors-MLCC---SMD-SMT_Darfon-Elec-Darfon-Elec-C1005NP0180KGT_C267387.html
footprint CAP-0402 (0402 (1005M) Capacitor)
pins: 1, 2

## C1005NP0180KGTS
designator C?  Capacitance: 18pF  (hidden comment: *)
Capacitor, Ceramic (MLCC), 18pF, ±10%, 50V, NP0, ±10%, SMD 0402; Manufacturer: Darfon Elec; Manufacturer Part Number: C1005NP0180KGTS; Package Size: 0402; JLCPCB Basic Part: No; JLCPCB Part Number: C312095; Supplier 1: LCSC; Category: Capacitors - MLCC; Supplier Part Number 1: C312095; Tolerance: ±10%; Voltage Rating: 50V; Temperature Coefficient: NP0; RoHS: Yes; ComponentLink1Description: Datasheet; ComponentLink1URL: https://wmsc.lcsc.com/wmsc/upload/file/pdf/v2/lcsc/2304140030_Darfon-Elec-C1005NP0180KGTS_C312095.pdf; ComponentLink2Description: JLCPCB Part URL; ComponentLink2URL: https://jlcpcb.com/partdetail/C312095; ComponentLink3Description: LCSC Part URL; ComponentLink3URL: https://lcsc.com/product-detail/Multilayer-Ceramic-Capacitors-MLCC---SMD-SMT_Darfon-Elec-Darfon-Elec-C1005NP0180KGTS_C312095.html
footprint CAP-0402 (0402 (1005M) Capacitor)
pins: 1, 2
